# Altium footprint library CONN_HDR_1.27MM_ST_SMD.PcbLib: 118 footprints (part 3 of 8)
Each footprint in its own frame and in the unit in brackets; x right, y up, seen from the top. Pads: shape width x height; smd on the part's side, far side on the other; paste and mask are expansions set on the pad; w line width, h text height; cw(c..) or ccw(c..) is an arc to the next point about the centre after c.
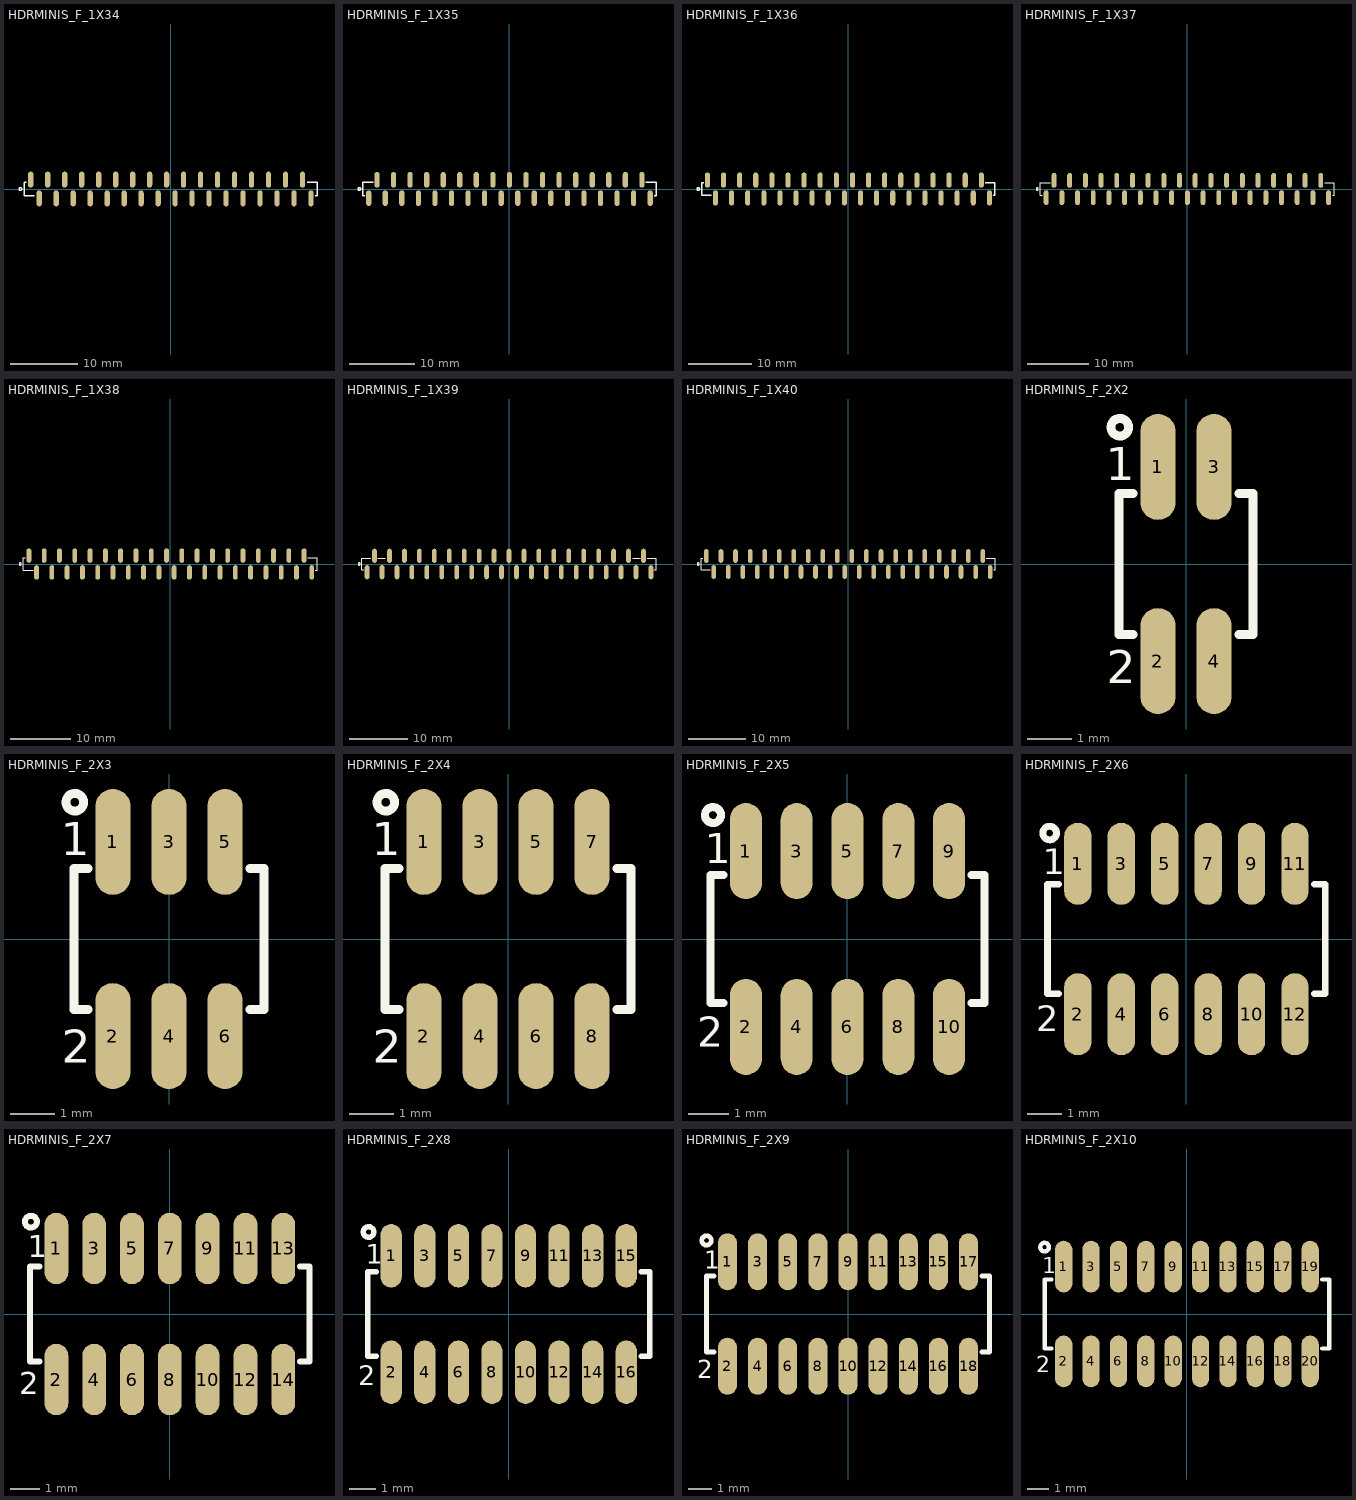
[diagram p2: the footprints below, top view; thin cyan lines are the x and y axes]

## HDRMINIS_F_1X34 [mm] "mini header (50mil pitch)"
pads (34):
  oval 0.8x2.4 smd mask+0.1: 1(-20.955,1.4) 2(-19.685,-1.4) 3(-18.415,1.4) 4(-17.145,-1.4) 5(-15.875,1.4) 6(-14.605,-1.4) 7(-13.335,1.4) 8(-12.065,-1.4) 9(-10.795,1.4) 10(-9.525,-1.4) 11(-8.255,1.4) 12(-6.985,-1.4) 13(-5.715,1.4) 14(-4.445,-1.4) 15(-3.175,1.4) 16(-1.905,-1.4) 17(-0.635,1.4) 18(0.635,-1.4) 19(1.905,1.4) 20(3.175,-1.4) 21(4.445,1.4) 22(5.715,-1.4) 23(6.985,1.4) 24(8.255,-1.4) 25(9.525,1.4) 26(10.795,-1.4) 27(12.065,1.4) 28(13.335,-1.4) 29(14.605,1.4) 30(15.875,-1.4) 31(17.145,1.4) 32(18.415,-1.4) 33(19.685,1.4) 34(20.955,-1.4)
Top Overlay:
  circle w0.2: c-22.5,0 r0.2
  lines w0.2: -21.6,1 -21.9,1 -21.9,-1 -20.4,-1 ; 20.4,1 21.9,1 21.9,-1 21.6,-1
3D body "a-bl127-eg-z02mr1.step": height 4.65, standoff 0.05, extent -21.79,-1.6 -18.85,1.6
3D body "a-bl127-eg-z02mr1.step": height 4.65, standoff 0.05, extent -19.25,-1.6 -16.31,1.6
3D body "a-bl127-eg-z02mr1.step": height 4.65, standoff 0.05, extent -16.71,-1.6 -13.77,1.6
3D body "a-bl127-eg-z02mr1.step": height 4.65, standoff 0.05, extent -14.17,-1.6 -11.23,1.6
3D body "a-bl127-eg-z02mr1.step": height 4.65, standoff 0.05, extent -11.63,-1.6 -8.69,1.6
3D body "a-bl127-eg-z02mr1.step": height 4.65, standoff 0.05, extent -9.09,-1.6 -6.15,1.6
3D body "a-bl127-eg-z02mr1.step": height 4.65, standoff 0.05, extent 1.07,-1.6 4.01,1.6
3D body "a-bl127-eg-z02mr1.step": height 4.65, standoff 0.05, extent -1.47,-1.6 1.47,1.6
3D body "a-bl127-eg-z02mr1.step": height 4.65, standoff 0.05, extent -4.01,-1.6 -1.07,1.6
3D body "a-bl127-eg-z02mr1.step": height 4.65, standoff 0.05, extent -6.55,-1.6 -3.61,1.6
3D body "a-bl127-eg-z02mr1.step": height 4.65, standoff 0.05, extent 18.85,-1.6 21.79,1.6
3D body "a-bl127-eg-z02mr1.step": height 4.65, standoff 0.05, extent 16.31,-1.6 19.25,1.6
3D body "a-bl127-eg-z02mr1.step": height 4.65, standoff 0.05, extent 13.77,-1.6 16.71,1.6
3D body "a-bl127-eg-z02mr1.step": height 4.65, standoff 0.05, extent 11.23,-1.6 14.17,1.6
3D body "a-bl127-eg-z02mr1.step": height 4.65, standoff 0.05, extent 8.69,-1.6 11.63,1.6
3D body "a-bl127-eg-z02mr1.step": height 4.65, standoff 0.05, extent 6.15,-1.6 9.09,1.6
3D body "a-bl127-eg-z02mr1.step": height 4.65, standoff 0.05, extent 3.61,-1.6 6.55,1.6

## HDRMINIS_F_1X35 [mm] "mini header (50mil pitch)"
pads (35):
  oval 0.8x2.4 smd mask+0.1: 1(-21.59,-1.4) 2(-20.32,1.4) 3(-19.05,-1.4) 4(-17.78,1.4) 5(-16.51,-1.4) 6(-15.24,1.4) 7(-13.97,-1.4) 8(-12.7,1.4) 9(-11.43,-1.4) 10(-10.16,1.4) 11(-8.89,-1.4) 12(-7.62,1.4) 13(-6.35,-1.4) 14(-5.08,1.4) 15(-3.81,-1.4) 16(-2.54,1.4) 17(-1.27,-1.4) 18(0,1.4) 19(1.27,-1.4) 20(2.54,1.4) 21(3.81,-1.4) 22(5.08,1.4) 23(6.35,-1.4) 24(7.62,1.4) 25(8.89,-1.4) 26(10.16,1.4) 27(11.43,-1.4) 28(12.7,1.4) 29(13.97,-1.4) 30(15.24,1.4) 31(16.51,-1.4) 32(17.78,1.4) 33(19.05,-1.4) 34(20.32,1.4) 35(21.59,-1.4)
Top Overlay:
  circle w0.2: c-23.033,0 r0.2
  lines w0.2: -22.2,-1 -22.5,-1 -22.5,1 -20.9,1 ; 20.9,1 22.5,1 22.5,-1 22.2,-1
3D body "a-bl127-eg-z02mr1.step": height 4.65, standoff 0.05, extent 6.785,-1.6 9.725,1.6
3D body "a-bl127-eg-z02mr1.step": height 4.65, standoff 0.05, extent 9.325,-1.6 12.265,1.6
3D body "a-bl127-eg-z02mr1.step": height 4.65, standoff 0.05, extent 11.865,-1.6 14.805,1.6
3D body "a-bl127-eg-z02mr1.step": height 4.65, standoff 0.05, extent 14.405,-1.6 17.345,1.6
3D body "a-bl127-eg-z02mr1.step": height 4.65, standoff 0.05, extent 16.945,-1.6 19.885,1.6
3D body "a-bl127-eg-z02mr1.step": height 4.65, standoff 0.05, extent 19.485,-1.6 22.425,1.6
3D body "a-bl127-eg-z02mr1.step": height 4.65, standoff 0.05, extent -3.375,-1.6 -0.435,1.6
3D body "a-bl127-eg-z02mr1.step": height 4.65, standoff 0.05, extent -0.835,-1.6 2.105,1.6
3D body "a-bl127-eg-z02mr1.step": height 4.65, standoff 0.05, extent 1.705,-1.6 4.645,1.6
3D body "a-bl127-eg-z02mr1.step": height 4.65, standoff 0.05, extent 4.245,-1.6 7.185,1.6
3D body "a-bl127-eg-z02mr1.step": height 4.65, standoff 0.05, extent -5.915,-1.6 -2.975,1.6
3D body "a-bl127-eg-z02mr1.step": height 4.65, standoff 0.05, extent -8.455,-1.6 -5.515,1.6
3D body "a-bl127-eg-z02mr1.step": height 4.65, standoff 0.05, extent -10.995,-1.6 -8.055,1.6
3D body "a-bl127-eg-z02mr1.step": height 4.65, standoff 0.05, extent -13.535,-1.6 -10.595,1.6
3D body "a-bl127-eg-z02mr1.step": height 4.65, standoff 0.05, extent -16.075,-1.6 -13.135,1.6
3D body "a-bl127-eg-z02mr1.step": height 4.65, standoff 0.05, extent -18.615,-1.6 -15.675,1.6
3D body "a-bl127-eg-z03mr1.stp": height 4.65, standoff 0.05, extent -22.425,-1.6 -18.215,1.6

## HDRMINIS_F_1X36 [mm] "mini header (50mil pitch)"
pads (36):
  oval 0.8x2.4 smd mask+0.1: 1(-22.225,1.4) 2(-20.955,-1.4) 3(-19.685,1.4) 4(-18.415,-1.4) 5(-17.145,1.4) 6(-15.875,-1.4) 7(-14.605,1.4) 8(-13.335,-1.4) 9(-12.065,1.4) 10(-10.795,-1.4) 11(-9.525,1.4) 12(-8.255,-1.4) 13(-6.985,1.4) 14(-5.715,-1.4) 15(-4.445,1.4) 16(-3.175,-1.4) 17(-1.905,1.4) 18(-0.635,-1.4) 19(0.635,1.4) 20(1.905,-1.4) 21(3.175,1.4) 22(4.445,-1.4) 23(5.715,1.4) 24(6.985,-1.4) 25(8.255,1.4) 26(9.525,-1.4) 27(10.795,1.4) 28(12.065,-1.4) 29(13.335,1.4) 30(14.605,-1.4) 31(15.875,1.4) 32(17.145,-1.4) 33(18.415,1.4) 34(19.685,-1.4) 35(20.955,1.4) 36(22.225,-1.4)
Top Overlay:
  circle w0.2: c-23.668,0 r0.2
  lines w0.2: -22.8,1 -23.1,1 -23.1,-1 -21.6,-1 ; 21.6,1 23.1,1 23.1,-1 22.8,-1
3D body "a-bl127-eg-z02mr1.step": height 4.65, standoff 0.05, extent 2.34,-1.6 5.28,1.6
3D body "a-bl127-eg-z02mr1.step": height 4.65, standoff 0.05, extent 4.88,-1.6 7.82,1.6
3D body "a-bl127-eg-z02mr1.step": height 4.65, standoff 0.05, extent 7.42,-1.6 10.36,1.6
3D body "a-bl127-eg-z02mr1.step": height 4.65, standoff 0.05, extent 9.96,-1.6 12.9,1.6
3D body "a-bl127-eg-z02mr1.step": height 4.65, standoff 0.05, extent 12.5,-1.6 15.44,1.6
3D body "a-bl127-eg-z02mr1.step": height 4.65, standoff 0.05, extent 15.04,-1.6 17.98,1.6
3D body "a-bl127-eg-z02mr1.step": height 4.65, standoff 0.05, extent 20.12,-1.6 23.06,1.6
3D body "a-bl127-eg-z02mr1.step": height 4.65, standoff 0.05, extent 17.58,-1.6 20.52,1.6
3D body "a-bl127-eg-z02mr1.step": height 4.65, standoff 0.05, extent -7.82,-1.6 -4.88,1.6
3D body "a-bl127-eg-z02mr1.step": height 4.65, standoff 0.05, extent -5.28,-1.6 -2.34,1.6
3D body "a-bl127-eg-z02mr1.step": height 4.65, standoff 0.05, extent -2.74,-1.6 0.2,1.6
3D body "a-bl127-eg-z02mr1.step": height 4.65, standoff 0.05, extent -0.2,-1.6 2.74,1.6
3D body "a-bl127-eg-z02mr1.step": height 4.65, standoff 0.05, extent -10.36,-1.6 -7.42,1.6
3D body "a-bl127-eg-z02mr1.step": height 4.65, standoff 0.05, extent -12.9,-1.6 -9.96,1.6
3D body "a-bl127-eg-z02mr1.step": height 4.65, standoff 0.05, extent -15.44,-1.6 -12.5,1.6
3D body "a-bl127-eg-z02mr1.step": height 4.65, standoff 0.05, extent -17.98,-1.6 -15.04,1.6
3D body "a-bl127-eg-z02mr1.step": height 4.65, standoff 0.05, extent -20.52,-1.6 -17.58,1.6
3D body "a-bl127-eg-z02mr1.step": height 4.65, standoff 0.05, extent -23.06,-1.6 -20.12,1.6

## HDRMINIS_F_1X37 [mm] "mini header (50mil pitch)"
pads (37):
  oval 0.8x2.4 smd mask+0.1: 1(-22.86,-1.4) 2(-21.59,1.4) 3(-20.32,-1.4) 4(-19.05,1.4) 5(-17.78,-1.4) 6(-16.51,1.4) 7(-15.24,-1.4) 8(-13.97,1.4) 9(-12.7,-1.4) 10(-11.43,1.4) 11(-10.16,-1.4) 12(-8.89,1.4) 13(-7.62,-1.4) 14(-6.35,1.4) 15(-5.08,-1.4) 16(-3.81,1.4) 17(-2.54,-1.4) 18(-1.27,1.4) 19(0,-1.4) 20(1.27,1.4) 21(2.54,-1.4) 22(3.81,1.4) 23(5.08,-1.4) 24(6.35,1.4) 25(7.62,-1.4) 26(8.89,1.4) 27(10.16,-1.4) 28(11.43,1.4) 29(12.7,-1.4) 30(13.97,1.4) 31(15.24,-1.4) 32(16.51,1.4) 33(17.78,-1.4) 34(19.05,1.4) 35(20.32,-1.4) 36(21.59,1.4) 37(22.86,-1.4)
Top Overlay:
  circle w0.2: c-24.303,0 r0.2
  lines w0.2: -23.5,-1 -23.8,-1 -23.8,1 -22.2,1 ; 22.2,1 23.8,1 23.8,-1 23.5,-1
3D body "a-bl127-eg-z03mr1.stp": height 4.65, standoff 0.05, extent -23.695,-1.6 -19.485,1.6
3D body "a-bl127-eg-z02mr1.step": height 4.65, standoff 0.05, extent -19.885,-1.6 -16.945,1.6
3D body "a-bl127-eg-z02mr1.step": height 4.65, standoff 0.05, extent -17.345,-1.6 -14.405,1.6
3D body "a-bl127-eg-z02mr1.step": height 4.65, standoff 0.05, extent -14.805,-1.6 -11.865,1.6
3D body "a-bl127-eg-z02mr1.step": height 4.65, standoff 0.05, extent -12.265,-1.6 -9.325,1.6
3D body "a-bl127-eg-z02mr1.step": height 4.65, standoff 0.05, extent -9.725,-1.6 -6.785,1.6
3D body "a-bl127-eg-z02mr1.step": height 4.65, standoff 0.05, extent -7.185,-1.6 -4.245,1.6
3D body "a-bl127-eg-z02mr1.step": height 4.65, standoff 0.05, extent 2.975,-1.6 5.915,1.6
3D body "a-bl127-eg-z02mr1.step": height 4.65, standoff 0.05, extent 0.435,-1.6 3.375,1.6
3D body "a-bl127-eg-z02mr1.step": height 4.65, standoff 0.05, extent -2.105,-1.6 0.835,1.6
3D body "a-bl127-eg-z02mr1.step": height 4.65, standoff 0.05, extent -4.645,-1.6 -1.705,1.6
3D body "a-bl127-eg-z02mr1.step": height 4.65, standoff 0.05, extent 20.755,-1.6 23.695,1.6
3D body "a-bl127-eg-z02mr1.step": height 4.65, standoff 0.05, extent 18.215,-1.6 21.155,1.6
3D body "a-bl127-eg-z02mr1.step": height 4.65, standoff 0.05, extent 15.675,-1.6 18.615,1.6
3D body "a-bl127-eg-z02mr1.step": height 4.65, standoff 0.05, extent 13.135,-1.6 16.075,1.6
3D body "a-bl127-eg-z02mr1.step": height 4.65, standoff 0.05, extent 10.595,-1.6 13.535,1.6
3D body "a-bl127-eg-z02mr1.step": height 4.65, standoff 0.05, extent 8.055,-1.6 10.995,1.6
3D body "a-bl127-eg-z02mr1.step": height 4.65, standoff 0.05, extent 5.515,-1.6 8.455,1.6

## HDRMINIS_F_1X38 [mm] "mini header (50mil pitch)"
pads (38):
  oval 0.8x2.4 smd mask+0.1: 1(-23.495,1.4) 2(-22.225,-1.4) 3(-20.955,1.4) 4(-19.685,-1.4) 5(-18.415,1.4) 6(-17.145,-1.4) 7(-15.875,1.4) 8(-14.605,-1.4) 9(-13.335,1.4) 10(-12.065,-1.4) 11(-10.795,1.4) 12(-9.525,-1.4) 13(-8.255,1.4) 14(-6.985,-1.4) 15(-5.715,1.4) 16(-4.445,-1.4) 17(-3.175,1.4) 18(-1.905,-1.4) 19(-0.635,1.4) 20(0.635,-1.4) 21(1.905,1.4) 22(3.175,-1.4) 23(4.445,1.4) 24(5.715,-1.4) 25(6.985,1.4) 26(8.255,-1.4) 27(9.525,1.4) 28(10.795,-1.4) 29(12.065,1.4) 30(13.335,-1.4) 31(14.605,1.4) 32(15.875,-1.4) 33(17.145,1.4) 34(18.415,-1.4) 35(19.685,1.4) 36(20.955,-1.4) 37(22.225,1.4) 38(23.495,-1.4)
Top Overlay:
  circle w0.2: c-24.938,0 r0.2
  lines w0.2: -24.1,1 -24.4,1 -24.4,-1 -22.8,-1 ; 22.8,1 24.4,1 24.4,-1 24.1,-1
3D body "a-bl127-eg-z02mr1.step": height 4.65, standoff 0.05, extent 1.07,-1.6 4.01,1.6
3D body "a-bl127-eg-z02mr1.step": height 4.65, standoff 0.05, extent 3.61,-1.6 6.55,1.6
3D body "a-bl127-eg-z02mr1.step": height 4.65, standoff 0.05, extent 6.15,-1.6 9.09,1.6
3D body "a-bl127-eg-z02mr1.step": height 4.65, standoff 0.05, extent 8.69,-1.6 11.63,1.6
3D body "a-bl127-eg-z02mr1.step": height 4.65, standoff 0.05, extent 11.23,-1.6 14.17,1.6
3D body "a-bl127-eg-z02mr1.step": height 4.65, standoff 0.05, extent 13.77,-1.6 16.71,1.6
3D body "a-bl127-eg-z02mr1.step": height 4.65, standoff 0.05, extent 21.39,-1.6 24.33,1.6
3D body "a-bl127-eg-z02mr1.step": height 4.65, standoff 0.05, extent 18.85,-1.6 21.79,1.6
3D body "a-bl127-eg-z02mr1.step": height 4.65, standoff 0.05, extent 16.31,-1.6 19.25,1.6
3D body "a-bl127-eg-z02mr1.step": height 4.65, standoff 0.05, extent -9.09,-1.6 -6.15,1.6
3D body "a-bl127-eg-z02mr1.step": height 4.65, standoff 0.05, extent -6.55,-1.6 -3.61,1.6
3D body "a-bl127-eg-z02mr1.step": height 4.65, standoff 0.05, extent -4.01,-1.6 -1.07,1.6
3D body "a-bl127-eg-z02mr1.step": height 4.65, standoff 0.05, extent -1.47,-1.6 1.47,1.6
3D body "a-bl127-eg-z02mr1.step": height 4.65, standoff 0.05, extent -11.63,-1.6 -8.69,1.6
3D body "a-bl127-eg-z02mr1.step": height 4.65, standoff 0.05, extent -14.17,-1.6 -11.23,1.6
3D body "a-bl127-eg-z02mr1.step": height 4.65, standoff 0.05, extent -16.71,-1.6 -13.77,1.6
3D body "a-bl127-eg-z02mr1.step": height 4.65, standoff 0.05, extent -19.25,-1.6 -16.31,1.6
3D body "a-bl127-eg-z02mr1.step": height 4.65, standoff 0.05, extent -21.79,-1.6 -18.85,1.6
3D body "a-bl127-eg-z02mr1.step": height 4.65, standoff 0.05, extent -24.33,-1.6 -21.39,1.6

## HDRMINIS_F_1X39 [mm] "mini header (50mil pitch)"
pads (39):
  oval 0.8x2.4 smd mask+0.1: 1(-24.13,-1.4) 2(-22.86,1.4) 3(-21.59,-1.4) 4(-20.32,1.4) 5(-19.05,-1.4) 6(-17.78,1.4) 7(-16.51,-1.4) 8(-15.24,1.4) 9(-13.97,-1.4) 10(-12.7,1.4) 11(-11.43,-1.4) 12(-10.16,1.4) 13(-8.89,-1.4) 14(-7.62,1.4) 15(-6.35,-1.4) 16(-5.08,1.4) 17(-3.81,-1.4) 18(-2.54,1.4) 19(-1.27,-1.4) 20(0,1.4) 21(1.27,-1.4) 22(2.54,1.4) 23(3.81,-1.4) 24(5.08,1.4) 25(6.35,-1.4) 26(7.62,1.4) 27(8.89,-1.4) 28(10.16,1.4) 29(11.43,-1.4) 30(12.7,1.4) 31(13.97,-1.4) 32(15.24,1.4) 33(16.51,-1.4) 34(17.78,1.4) 35(19.05,-1.4) 36(20.32,1.4) 37(21.59,-1.4) 38(22.86,1.4) 39(24.13,-1.4)
Top Overlay:
  circle w0.2: c-25.473,0 r0.2
  lines w0.2: -24.7,-1 -25,-1 -25,1 -23.5,1 ; -22.3,1 -21,1 ; 21,1 22.3,1 ; 23.5,1 25,1 25,-1 24.7,-1
3D body "a-bl127-eg-z03mr1.stp": height 4.65, standoff 0.05, extent -24.965,-1.6 -20.755,1.6
3D body "a-bl127-eg-z02mr1.step": height 4.65, standoff 0.05, extent -21.155,-1.6 -18.215,1.6
3D body "a-bl127-eg-z02mr1.step": height 4.65, standoff 0.05, extent -18.615,-1.6 -15.675,1.6
3D body "a-bl127-eg-z02mr1.step": height 4.65, standoff 0.05, extent -16.075,-1.6 -13.135,1.6
3D body "a-bl127-eg-z02mr1.step": height 4.65, standoff 0.05, extent -13.535,-1.6 -10.595,1.6
3D body "a-bl127-eg-z02mr1.step": height 4.65, standoff 0.05, extent -10.995,-1.6 -8.055,1.6
3D body "a-bl127-eg-z02mr1.step": height 4.65, standoff 0.05, extent -8.455,-1.6 -5.515,1.6
3D body "a-bl127-eg-z02mr1.step": height 4.65, standoff 0.05, extent 1.705,-1.6 4.645,1.6
3D body "a-bl127-eg-z02mr1.step": height 4.65, standoff 0.05, extent -0.835,-1.6 2.105,1.6
3D body "a-bl127-eg-z02mr1.step": height 4.65, standoff 0.05, extent -3.375,-1.6 -0.435,1.6
3D body "a-bl127-eg-z02mr1.step": height 4.65, standoff 0.05, extent -5.915,-1.6 -2.975,1.6
3D body "a-bl127-eg-z02mr1.step": height 4.65, standoff 0.05, extent 19.485,-1.6 22.425,1.6
3D body "a-bl127-eg-z02mr1.step": height 4.65, standoff 0.05, extent 22.025,-1.6 24.965,1.6
3D body "a-bl127-eg-z02mr1.step": height 4.65, standoff 0.05, extent 16.945,-1.6 19.885,1.6
3D body "a-bl127-eg-z02mr1.step": height 4.65, standoff 0.05, extent 14.405,-1.6 17.345,1.6
3D body "a-bl127-eg-z02mr1.step": height 4.65, standoff 0.05, extent 11.865,-1.6 14.805,1.6
3D body "a-bl127-eg-z02mr1.step": height 4.65, standoff 0.05, extent 9.325,-1.6 12.265,1.6
3D body "a-bl127-eg-z02mr1.step": height 4.65, standoff 0.05, extent 6.785,-1.6 9.725,1.6
3D body "a-bl127-eg-z02mr1.step": height 4.65, standoff 0.05, extent 4.245,-1.6 7.185,1.6

## HDRMINIS_F_1X40 [mm] "mini header (50mil pitch)"
pads (40):
  oval 0.8x2.4 smd mask+0.1: 1(-24.765,1.4) 2(-23.495,-1.4) 3(-22.225,1.4) 4(-20.955,-1.4) 5(-19.685,1.4) 6(-18.415,-1.4) 7(-17.145,1.4) 8(-15.875,-1.4) 9(-14.605,1.4) 10(-13.335,-1.4) 11(-12.065,1.4) 12(-10.795,-1.4) 13(-9.525,1.4) 14(-8.255,-1.4) 15(-6.985,1.4) 16(-5.715,-1.4) 17(-4.445,1.4) 18(-3.175,-1.4) 19(-1.905,1.4) 20(-0.635,-1.4) 21(0.635,1.4) 22(1.905,-1.4) 23(3.175,1.4) 24(4.445,-1.4) 25(5.715,1.4) 26(6.985,-1.4) 27(8.255,1.4) 28(9.525,-1.4) 29(10.795,1.4) 30(12.065,-1.4) 31(13.335,1.4) 32(14.605,-1.4) 33(15.875,1.4) 34(17.145,-1.4) 35(18.415,1.4) 36(19.685,-1.4) 37(20.955,1.4) 38(22.225,-1.4) 39(23.495,1.4) 40(24.765,-1.4)
Top Overlay:
  circle w0.2: c-26.208,0 r0.2
  lines w0.2: -25.4,1 -25.7,1 -25.7,-1 -24.1,-1 ; 24.1,1 25.7,1 25.7,-1 25.4,-1
3D body "a-bl127-eg-z02mr1.step": height 4.65, standoff 0.05, extent -0.2,-1.6 2.74,1.6
3D body "a-bl127-eg-z02mr1.step": height 4.65, standoff 0.05, extent 2.34,-1.6 5.28,1.6
3D body "a-bl127-eg-z02mr1.step": height 4.65, standoff 0.05, extent 4.88,-1.6 7.82,1.6
3D body "a-bl127-eg-z02mr1.step": height 4.65, standoff 0.05, extent 7.42,-1.6 10.36,1.6
3D body "a-bl127-eg-z02mr1.step": height 4.65, standoff 0.05, extent 9.96,-1.6 12.9,1.6
3D body "a-bl127-eg-z02mr1.step": height 4.65, standoff 0.05, extent 12.5,-1.6 15.44,1.6
3D body "a-bl127-eg-z02mr1.step": height 4.65, standoff 0.05, extent 22.66,-1.6 25.6,1.6
3D body "a-bl127-eg-z02mr1.step": height 4.65, standoff 0.05, extent 20.12,-1.6 23.06,1.6
3D body "a-bl127-eg-z02mr1.step": height 4.65, standoff 0.05, extent 17.58,-1.6 20.52,1.6
3D body "a-bl127-eg-z02mr1.step": height 4.65, standoff 0.05, extent 15.04,-1.6 17.98,1.6
3D body "a-bl127-eg-z02mr1.step": height 4.65, standoff 0.05, extent -10.36,-1.6 -7.42,1.6
3D body "a-bl127-eg-z02mr1.step": height 4.65, standoff 0.05, extent -7.82,-1.6 -4.88,1.6
3D body "a-bl127-eg-z02mr1.step": height 4.65, standoff 0.05, extent -5.28,-1.6 -2.34,1.6
3D body "a-bl127-eg-z02mr1.step": height 4.65, standoff 0.05, extent -2.74,-1.6 0.2,1.6
3D body "a-bl127-eg-z02mr1.step": height 4.65, standoff 0.05, extent -12.9,-1.6 -9.96,1.6
3D body "a-bl127-eg-z02mr1.step": height 4.65, standoff 0.05, extent -15.44,-1.6 -12.5,1.6
3D body "a-bl127-eg-z02mr1.step": height 4.65, standoff 0.05, extent -17.98,-1.6 -15.04,1.6
3D body "a-bl127-eg-z02mr1.step": height 4.65, standoff 0.05, extent -20.52,-1.6 -17.58,1.6
3D body "a-bl127-eg-z02mr1.step": height 4.65, standoff 0.05, extent -23.06,-1.6 -20.12,1.6
3D body "a-bl127-eg-z02mr1.step": height 4.65, standoff 0.05, extent -25.6,-1.6 -22.66,1.6

## HDRMINIS_F_2X2 [mm] "HEADER FEMALE, SMT, 4, 1.27mm"
pads (4):
  oval 0.8x2.4 smd mask+0.1: 1(-0.635,2.2) 2(-0.635,-2.2) 3(0.635,2.2) 4(0.635,-2.2)
Top Overlay:
  circle w0.2: c-1.5,3.1 r0.2
  lines w0.2: -1.2,-1.6 -1.52,-1.6 -1.52,1.6 -1.2,1.6 ; 1.2,-1.6 1.52,-1.6 1.52,1.6 1.2,1.6
  text "2" at -1.8,-2.7 h0.75
  text "1" at -1.82,1.9 h0.75
3D body "User Library-1_27x1_27-SMD-female-2x2.step": height 4.5, standoff 0, extent -1.46,-2.3 1.46,2.3

## HDRMINIS_F_2X3 [mm] "HEADER FEMALE, SMT, 8, 1.27mm"
pads (6):
  oval 0.8x2.4 smd mask+0.1: 1(-1.27,2.2) 2(-1.27,-2.2) 3(0,2.2) 4(0,-2.2) 5(1.27,2.2) 6(1.27,-2.2)
Top Overlay:
  circle w0.2: c-2.135,3.1 r0.2
  lines w0.2: -1.835,-1.6 -2.155,-1.6 -2.155,1.6 -1.835,1.6 ; 1.835,-1.6 2.155,-1.6 2.155,1.6 1.835,1.6
  text "2" at -2.435,-2.8 h0.75
  text "1" at -2.455,1.9 h0.75
3D body "User Library-1_27x1_27-SMD-female-2x2.step": height 4.5, standoff 0, extent -2.095,-2.3 0.825,2.3
3D body "User Library-1_27x1_27-SMD-female-2x2.step": height 4.5, standoff 0, extent -0.825,-2.3 2.095,2.3

## HDRMINIS_F_2X4 [mm] "HEADER FEMALE, SMT, 8, 1.27mm"
pads (8):
  oval 0.8x2.4 smd mask+0.1: 1(-1.905,2.2) 2(-1.905,-2.2) 3(-0.635,2.2) 4(-0.635,-2.2) 5(0.635,2.2) 6(0.635,-2.2) 7(1.905,2.2) 8(1.905,-2.2)
Top Overlay:
  circle w0.2: c-2.77,3.1 r0.2
  lines w0.2: -2.47,-1.6 -2.79,-1.6 -2.79,1.6 -2.47,1.6 ; 2.47,-1.6 2.79,-1.6 2.79,1.6 2.47,1.6
  text "1" at -3.09,1.9 h0.75
  text "2" at -3.07,-2.8 h0.75
3D body "User Library-1_27x1_27-SMD-female-2x2.step": height 4.5, standoff 0, extent -0.19,-2.3 2.73,2.3
3D body "User Library-1_27x1_27-SMD-female-2x2.step": height 4.5, standoff 0, extent -2.73,-2.3 0.19,2.3

## HDRMINIS_F_2X5 [mm] "HEADER FEMALE, SMT, 12, 1.27mm"
pads (10):
  oval 0.8x2.4 smd mask+0.1: 1(-2.54,2.2) 2(-2.54,-2.2) 3(-1.27,2.2) 4(-1.27,-2.2) 5(0,2.2) 6(0,-2.2) 7(1.27,2.2) 8(1.27,-2.2) 9(2.54,2.2) 10(2.54,-2.2)
Top Overlay:
  circle w0.2: c-3.365,3.1 r0.2
  lines w0.2: -3.105,-1.6 -3.425,-1.6 -3.425,1.6 -3.105,1.6 ; 3.105,-1.6 3.425,-1.6 3.425,1.6 3.105,1.6
  text "1" at -3.565,1.9 h0.75
  text "2" at -3.765,-2.7 h0.75
3D body "User Library-1_27x1_27-SMD-female-2x2.step": height 4.5, standoff 0, extent 0.445,-2.3 3.365,2.3
3D body "User Library-1_27x1_27-SMD-female-2x2.step": height 4.5, standoff 0, extent -3.365,-2.3 -0.445,2.3
3D body "User Library-1_27x1_27-SMD-female-2x2.step": height 4.5, standoff 0, extent -0.825,-2.3 2.095,2.3

## HDRMINIS_F_2X6 [mm] "HEADER FEMALE, SMT, 12, 1.27mm"
pads (12):
  oval 0.8x2.4 smd mask+0.1: 1(-3.175,2.2) 2(-3.175,-2.2) 3(-1.905,2.2) 4(-1.905,-2.2) 5(-0.635,2.2) 6(-0.635,-2.2) 7(0.635,2.2) 8(0.635,-2.2) 9(1.905,2.2) 10(1.905,-2.2) 11(3.175,2.2) 12(3.175,-2.2)
Top Overlay:
  circle w0.2: c-4,3.1 r0.2
  lines w0.2: -3.74,-1.6 -4.06,-1.6 -4.06,1.6 -3.74,1.6 ; 3.74,-1.6 4.06,-1.6 4.06,1.6 3.74,1.6
  text "2" at -4.4,-2.7 h0.75
  text "1" at -4.2,1.9 h0.75
3D body "User Library-1_27x1_27-SMD-female-2x2.step": height 4.5, standoff 0, extent -1.46,-2.3 1.46,2.3
3D body "User Library-1_27x1_27-SMD-female-2x2.step": height 4.5, standoff 0, extent -4,-2.3 -1.08,2.3
3D body "User Library-1_27x1_27-SMD-female-2x2.step": height 4.5, standoff 0, extent 1.08,-2.3 4,2.3

## HDRMINIS_F_2X7 [mm] "HEADER FEMALE, SMT, 16, 1.27mm"
pads (14):
  oval 0.8x2.4 smd mask+0.1: 1(-3.81,2.2) 2(-3.81,-2.2) 3(-2.54,2.2) 4(-2.54,-2.2) 5(-1.27,2.2) 6(-1.27,-2.2) 7(0,2.2) 8(0,-2.2) 9(1.27,2.2) 10(1.27,-2.2) 11(2.54,2.2) 12(2.54,-2.2) 13(3.81,2.2) 14(3.81,-2.2)
Top Overlay:
  circle w0.2: c-4.665,3.1 r0.2
  lines w0.2: -4.375,-1.6 -4.695,-1.6 -4.695,1.6 -4.375,1.6 ; 4.375,-1.6 4.695,-1.6 4.695,1.6 4.375,1.6
  text "2" at -5.065,-2.7 h0.75
  text "1" at -4.765,1.9 h0.75
3D body "User Library-1_27x1_27-SMD-female-2x2.step": height 4.5, standoff 0, extent 1.715,-2.3 4.635,2.3
3D body "User Library-1_27x1_27-SMD-female-2x2.step": height 4.5, standoff 0, extent 0.445,-2.3 3.365,2.3
3D body "User Library-1_27x1_27-SMD-female-2x2.step": height 4.5, standoff 0, extent -2.095,-2.3 0.825,2.3
3D body "User Library-1_27x1_27-SMD-female-2x2.step": height 4.5, standoff 0, extent -4.635,-2.3 -1.715,2.3

## HDRMINIS_F_2X8 [mm] "HEADER FEMALE, SMT, 16, 1.27mm"
pads (16):
  oval 0.8x2.4 smd mask+0.1: 1(-4.445,2.2) 2(-4.445,-2.2) 3(-3.175,2.2) 4(-3.175,-2.2) 5(-1.905,2.2) 6(-1.905,-2.2) 7(-0.635,2.2) 8(-0.635,-2.2) 9(0.635,2.2) 10(0.635,-2.2) 11(1.905,2.2) 12(1.905,-2.2) 13(3.175,2.2) 14(3.175,-2.2) 15(4.445,2.2) 16(4.445,-2.2)
Top Overlay:
  circle w0.2: c-5.3,3.1 r0.2
  lines w0.2: -5.01,-1.6 -5.33,-1.6 -5.33,1.6 -5.01,1.6 ; 5.01,-1.6 5.33,-1.6 5.33,1.6 5.01,1.6
  text "1" at -5.4,1.9 h0.75
  text "2" at -5.7,-2.7 h0.75
3D body "User Library-1_27x1_27-SMD-female-2x2.step": height 4.5, standoff 0, extent -5.27,-2.3 -2.35,2.3
3D body "User Library-1_27x1_27-SMD-female-2x2.step": height 4.5, standoff 0, extent -2.73,-2.3 0.19,2.3
3D body "User Library-1_27x1_27-SMD-female-2x2.step": height 4.5, standoff 0, extent -0.19,-2.3 2.73,2.3
3D body "User Library-1_27x1_27-SMD-female-2x2.step": height 4.5, standoff 0, extent 2.35,-2.3 5.27,2.3

## HDRMINIS_F_2X9 [mm] "HEADER FEMALE, SMT, 20, 1.27mm"
pads (18):
  oval 0.8x2.4 smd mask+0.1: 1(-5.08,2.2) 2(-5.08,-2.2) 3(-3.81,2.2) 4(-3.81,-2.2) 5(-2.54,2.2) 6(-2.54,-2.2) 7(-1.27,2.2) 8(-1.27,-2.2) 9(0,2.2) 10(0,-2.2) 11(1.27,2.2) 12(1.27,-2.2) 13(2.54,2.2) 14(2.54,-2.2) 15(3.81,2.2) 16(3.81,-2.2) 17(5.08,2.2) 18(5.08,-2.2)
Top Overlay:
  circle w0.2: c-5.965,3.1 r0.2
  lines w0.2: -5.645,-1.6 -5.965,-1.6 -5.965,1.6 -5.645,1.6 ; 5.645,-1.6 5.965,-1.6 5.965,1.6 5.645,1.6
  text "2" at -6.365,-2.7 h0.75
  text "1" at -6.065,1.9 h0.75
3D body "User Library-1_27x1_27-SMD-female-2x2.step": height 4.5, standoff 0, extent -5.905,-2.3 -2.985,2.3
3D body "User Library-1_27x1_27-SMD-female-2x2.step": height 4.5, standoff 0, extent -3.365,-2.3 -0.445,2.3
3D body "User Library-1_27x1_27-SMD-female-2x2.step": height 4.5, standoff 0, extent -0.825,-2.3 2.095,2.3
3D body "User Library-1_27x1_27-SMD-female-2x2.step": height 4.5, standoff 0, extent 1.715,-2.3 4.635,2.3
3D body "User Library-1_27x1_27-SMD-female-2x2.step": height 4.5, standoff 0, extent 2.985,-2.3 5.905,2.3

## HDRMINIS_F_2X10 [mm] "HEADER FEMALE, SMT, 20, 1.27mm"
pads (20):
  oval 0.8x2.4 smd mask+0.1: 1(-5.715,2.2) 2(-5.715,-2.2) 3(-4.445,2.2) 4(-4.445,-2.2) 5(-3.175,2.2) 6(-3.175,-2.2) 7(-1.905,2.2) 8(-1.905,-2.2) 9(-0.635,2.2) 10(-0.635,-2.2) 11(0.635,2.2) 12(0.635,-2.2) 13(1.905,2.2) 14(1.905,-2.2) 15(3.175,2.2) 16(3.175,-2.2) 17(4.445,2.2) 18(4.445,-2.2) 19(5.715,2.2) 20(5.715,-2.2)
Top Overlay:
  circle w0.2: c-6.6,3.1 r0.2
  lines w0.2: -6.28,-1.6 -6.6,-1.6 -6.6,1.6 -6.28,1.6 ; 6.28,-1.6 6.6,-1.6 6.6,1.6 6.28,1.6
  text "2" at -7,-2.7 h0.75
  text "1" at -6.7,1.9 h0.75
3D body "User Library-1_27x1_27-SMD-female-2x2.step": height 4.5, standoff 0, extent -6.54,-2.3 -3.62,2.3
3D body "User Library-1_27x1_27-SMD-female-2x2.step": height 4.5, standoff 0, extent -4,-2.3 -1.08,2.3
3D body "User Library-1_27x1_27-SMD-female-2x2.step": height 4.5, standoff 0, extent -1.46,-2.3 1.46,2.3
3D body "User Library-1_27x1_27-SMD-female-2x2.step": height 4.5, standoff 0, extent 1.08,-2.3 4,2.3
3D body "User Library-1_27x1_27-SMD-female-2x2.step": height 4.5, standoff 0, extent 3.62,-2.3 6.54,2.3